# Altium footprint library LukaLIBRARY.PcbLib: 784 footprints (part 31 of 49)
Each footprint in its own frame and in the unit in brackets; x right, y up, seen from the top. Pads: shape width x height; smd on the part's side, far side on the other; paste and mask are expansions set on the pad; w line width, h text height; cw(c..) or ccw(c..) is an arc to the next point about the centre after c.
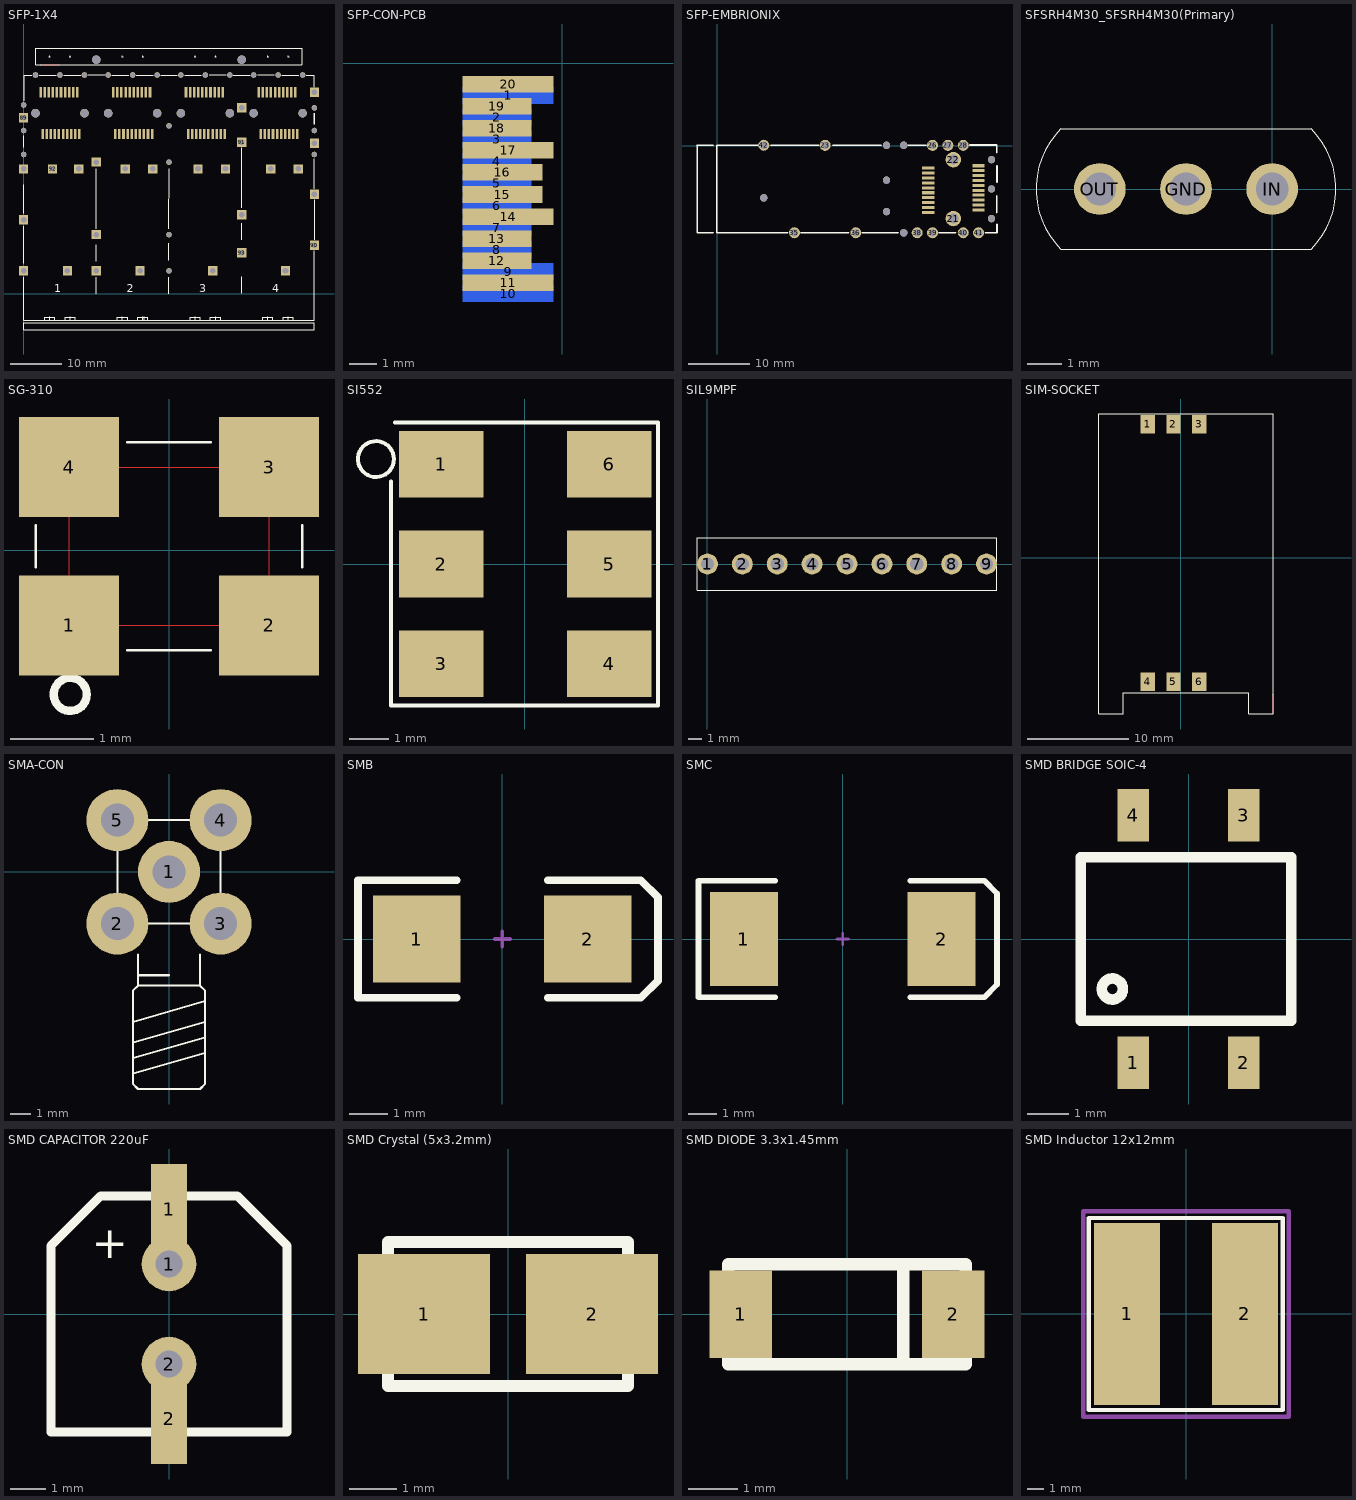
[diagram p30: the footprints below, top view; thin cyan lines are the x and y axes]

## SFP-1X4 [mm]
pads (139):
  rect 0.5x2 smd mask-25.4: 1(3.731,31.299) 2(4.531,31.299) 3(5.331,31.299) 4(6.131,31.299) 5(6.931,31.299) 6(7.731,31.299) 7(8.531,31.299) 8(9.331,31.299) 9(10.131,31.299) 10(10.931,31.299) 11(10.531,39.499) 12(9.731,39.499) 13(8.931,39.499) 14(8.131,39.499) 15(7.331,39.499) 16(6.531,39.499) 17(5.731,39.499) 18(4.931,39.499) 19(4.131,39.499) 20(3.331,39.499) 21(17.981,31.299) 22(18.781,31.299) 23(19.581,31.299) 24(20.381,31.299) 25(21.181,31.299) 26(21.981,31.299) 27(22.781,31.299) 28(23.581,31.299) 29(24.381,31.299) 30(25.181,31.299) 31(24.781,39.499) 32(23.981,39.499) 33(23.181,39.499) 34(22.381,39.499) 35(21.581,39.499) 36(20.781,39.499) 37(19.981,39.499) 38(19.181,39.499) 39(18.381,39.499) 40(17.581,39.499) 41(32.231,31.299) 42(33.031,31.299) 43(33.831,31.299) 44(34.631,31.299) 45(35.431,31.299) 46(36.231,31.299) 47(37.031,31.299) 48(37.831,31.299) 49(38.631,31.299) 50(39.431,31.299) 51(39.031,39.499) 52(38.231,39.499) 53(37.431,39.499) 54(36.631,39.499) 55(35.831,39.499) 56(35.031,39.499) 57(34.231,39.499) 58(33.431,39.499) 59(32.631,39.499) 60(31.831,39.499) 61(46.481,31.299) 62(47.281,31.299) 63(48.081,31.299) 64(48.881,31.299) 65(49.681,31.299) 66(50.481,31.299) 67(51.281,31.299) 68(52.081,31.299) 69(52.881,31.299) 70(53.681,31.299) 71(53.281,39.499) 72(52.481,39.499) 73(51.681,39.499) 74(50.881,39.499) 75(50.081,39.499) 76(49.281,39.499) 77(48.481,39.499) 78(47.681,39.499) 79(46.881,39.499) 80(46.081,39.499)
  round 1.1 hole 1: 81(2.33,42.88) 82(7.13,42.88) 83(11.93,42.88) 84(16.58,42.88) 85(21.38,42.88) 86(26.18,42.88) 87(30.83,42.88) 88(35.63,42.88) 107(0,27.3) 108(0,32) 109(0,37) 123(40.43,42.88) 124(45.08,42.88) 125(49.88,42.88) 126(54.68,42.88) 129(28.5,25.8) 130(57,36.45) 131(28.5,4.5) 132(57,32) 133(28.5,32.9) 134(28.5,11.6) 135(57,27.3)
  rect 1.8x1.8 hole 1.1 mask-25.4: 89(0,34.5) 90(57,9.5) 91(42.75,29.7) 92(5.68,24.49) 93(42.75,8.05) 102(10.8,24.49) 103(42.75,15.5) 104(0,24.49) 105(19.93,24.49) 106(34.18,24.49) 110(14.25,25.82) 111(8.58,4.5) 112(48.43,24.49) 113(0,14.5) 114(25.33,24.49) 115(39.58,24.49) 116(14.25,11.6) 117(53.83,24.49) 118(0.001,4.509) 119(22.83,4.51) 120(37.08,4.5) 121(14.25,4.5) 122(51.33,4.5) 136(42.75,36.45) 137(57,19.5) 138(57,29.5) 139(57,39.5)
  round 1.7 hole 1.6: 94(2.331,35.399) 95(11.931,35.399) 96(16.581,35.399) 97(26.181,35.399) 98(30.831,35.399) 99(40.431,35.399) 100(45.081,35.399) 101(54.681,35.399) 127(14.25,45.88) 128(42.75,45.88)
Top Layer:
  lines w0.1: 3.34,44.92 7.04,44.92 ; 4.14,48.12 5.84,48.12
Top Overlay:
  lines w0.01: 0,0 0,-5.18 57,-5.18 57,0 ; 4.12,-5.18 4.12,-4.57 5.12,-4.57 ; 5.12,-5.18 5.12,-4.48 ; 5.12,-4.58 6.12,-4.58 6.12,-5.17 ; 8.12,-5.18 8.12,-4.57 9.12,-4.57 ; 9.12,-5.18 9.12,-4.48 ; 9.12,-4.58 10.12,-4.58 10.12,-5.17 ; 18.37,-5.19 18.37,-4.58 19.37,-4.58 ; 19.37,-5.18 19.37,-4.48 ; 19.37,-4.59 20.37,-4.59 20.37,-5.18 ; 22.38,-5.18 22.38,-4.57 23.38,-4.57 ; 23.38,-5.18 23.38,-4.48 ; 23.38,-4.58 24.38,-4.58 24.38,-5.17 ; 23.63,-5.18 23.63,-4.48 ; 32.62,-5.18 32.62,-4.57 33.62,-4.57 ; 33.62,-5.18 33.62,-4.48 ; 33.62,-4.58 34.62,-4.58 34.62,-5.17 ; 36.62,-5.18 36.62,-4.57 37.62,-4.57 ; 37.62,-5.18 37.62,-4.48 ; 37.62,-4.58 38.62,-4.58 38.62,-5.17 ; 46.87,-5.18 46.87,-4.57 47.87,-4.57 ; 47.87,-5.18 47.87,-4.48 ; 47.87,-4.58 48.87,-4.58 48.87,-5.17 ; 50.88,-5.18 50.88,-4.57 51.88,-4.57 ; 51.88,-5.18 51.88,-4.48 ; 51.88,-4.58 52.88,-4.58 52.88,-5.17 ; 0,-7.04 0,-5.71 57,-5.71 57,-7.04 0,-7.04
  lines w0.05: 4.98,46.49 5.27,46.49 ; 5.12,46.35 5.12,46.64 ; 8.98,46.49 9.27,46.49 ; 9.12,46.35 9.12,46.64 ; 19.24,46.49 19.53,46.49 ; 19.38,46.35 19.38,46.64 ; 23.24,46.49 23.53,46.49 ; 23.38,46.35 23.38,46.64 ; 33.48,46.49 33.77,46.49 ; 33.62,46.35 33.62,46.64 ; 37.48,46.49 37.77,46.49 ; 37.62,46.35 37.62,46.64 ; 47.74,46.49 48.03,46.49 ; 47.88,46.35 47.88,46.64 ; 51.74,46.49 52.03,46.49 ; 51.88,46.35 51.88,46.64
  lines w0.1: 0,0.01 0.001,3.259 ; 0,28.75 0,31.02 ; 0.001,5.939 0.001,13.219 ; 0.001,37.879 0,42.88 1.591,42.881 ; 0.011,15.779 0.011,21.339 ; 3.06,42.88 6.36,42.88 ; 7.88,42.88 11.18,42.88 ; 12.6,42.89 15.9,42.89 ; 14.24,12.78 14.241,24.489 ; 14.25,0.02 14.251,3.269 ; 14.26,6.38 14.261,9.629 ; 17.31,42.88 20.61,42.88 ; 22.09,42.88 25.39,42.88 ; 26.84,42.88 30.14,42.88 ; 28.49,0.01 28.491,3.259 ; 28.49,6.61 28.491,9.859 ; 28.5,12.79 28.501,24.499 ; 31.54,42.88 34.84,42.88 ; 36.4,42.89 39.7,42.89 ; 41.1,42.88 44.4,42.88 ; 42.74,10.6 42.741,13.849 ; 42.75,0.07 42.751,3.319 ; 42.75,16.91 42.751,28.619 ; 45.86,42.89 49.16,42.89 ; 50.6,42.88 53.9,42.88 ; 54.54,44.92 2.34,44.92 2.34,48.12 54.64,48.12 54.64,44.92 ; 55.41,42.88 56.99,42.88 56.99,40.52 ; 57,0 57,8.4 ; 57,18.41 57.01,10.63 ; 57,20.61 57,26.49
  lines w0.254: 56.99,35.42 56.991,33.239
  text "1" at 5.97,0.28 h1.59
  text "4" at 48.71,0.29 h1.59
  text "2" at 20.23,0.33 h1.59
  text "3" at 34.47,0.3 h1.59
Top Solder:
  drawing of 107 lines, arcs and shapes, not listed
Bottom Solder:
  region: 0.9,13.6 0.9,15.4 -0.9,15.4 -0.9,13.6
  region: 0.9,23.59 0.9,25.39 -0.9,25.39 -0.9,23.59
  region: 11.7,23.59 11.7,25.39 9.9,25.39 9.9,23.59
  region: 15.15,10.7 15.15,12.5 13.35,12.5 13.35,10.7
  region: 15.15,24.92 15.15,26.72 13.35,26.72 13.35,24.92
  region: 26.23,23.59 26.23,25.39 24.43,25.39 24.43,23.59
  region: 35.08,23.59 35.08,25.39 33.28,25.39 33.28,23.59
  region: 40.48,23.59 40.48,25.39 38.68,25.39 38.68,23.59
  region: 49.33,23.59 49.33,25.39 47.53,25.39 47.53,23.59
  region: 57.9,8.6 57.9,10.4 56.1,10.4 56.1,8.6
  region: 54.73,23.59 54.73,25.39 52.93,25.39 52.93,23.59
  region: 57.9,28.6 57.9,30.4 56.1,30.4 56.1,28.6
  region: 57.9,38.6 57.9,40.4 56.1,40.4 56.1,38.6
  region: 0.901,3.609 0.901,5.409 -0.899,5.409 -0.899,3.609
  region: 0.9,33.6 0.9,35.4 -0.9,35.4 -0.9,33.6
  region: 9.48,3.6 9.48,5.4 7.68,5.4 7.68,3.6
  region: 15.15,3.6 15.15,5.4 13.35,5.4 13.35,3.6
  region: 23.73,3.61 23.73,5.41 21.93,5.41 21.93,3.61
  region: 37.98,3.6 37.98,5.4 36.18,5.4 36.18,3.6
  region: 57.9,18.6 57.9,20.4 56.1,20.4 56.1,18.6
  region: 6.58,23.59 6.58,25.39 4.78,25.39 4.78,23.59
  region: 20.83,23.59 20.83,25.39 19.03,25.39 19.03,23.59
  region: 43.65,7.15 43.65,8.95 41.85,8.95 41.85,7.15
  region: 43.65,14.6 43.65,16.4 41.85,16.4 41.85,14.6
  region: 43.65,28.8 43.65,30.6 41.85,30.6 41.85,28.8
  region: 52.23,3.6 52.23,5.4 50.43,5.4 50.43,3.6
  region: 43.65,35.55 43.65,37.35 41.85,37.35 41.85,35.55

## SFP-CON-PCB [mm]
pads (20):
  rect 3.3x0.6 smd far side mask-25.4: 1(-1.98,-1.16) 9(-1.98,-7.56) 10(-1.98,-8.36)
  rect 2.5x0.6 smd far side mask-25.4: 2(-2.38,-1.96) 3(-2.38,-2.76) 4(-2.38,-3.56) 5(-2.38,-4.36) 6(-2.38,-5.16) 7(-2.38,-5.96) 8(-2.38,-6.76)
  rect 3.3x0.6 smd mask-25.4: 11(-1.98,-7.96) 14(-1.98,-5.56) 17(-1.98,-3.16) 20(-1.98,-0.76)
  rect 2.5x0.6 smd mask-25.4: 12(-2.38,-7.16) 13(-2.38,-6.36) 18(-2.38,-2.36) 19(-2.38,-1.56)
  rect 2.9x0.6 smd mask-25.4: 15(-2.18,-4.76) 16(-2.18,-3.96)
Top Solder:
  region: -3.63,-7.46 -1.13,-7.46 -1.13,-6.86 -3.63,-6.86
  region: -3.63,-2.66 -1.13,-2.66 -1.13,-2.06 -3.63,-2.06
  region: -3.63,-1.86 -1.13,-1.86 -1.13,-1.26 -3.63,-1.26
  region: -3.63,-6.66 -1.13,-6.66 -1.13,-6.06 -3.63,-6.06
  region: -3.63,-8.26 -0.33,-8.26 -0.33,-7.66 -3.63,-7.66
  region: -3.63,-5.06 -0.73,-5.06 -0.73,-4.46 -3.63,-4.46
  region: -3.63,-3.46 -0.33,-3.46 -0.33,-2.86 -3.63,-2.86
  region: -3.63,-1.06 -0.33,-1.06 -0.33,-0.46 -3.63,-0.46
  region: -3.63,-5.86 -0.33,-5.86 -0.33,-5.26 -3.63,-5.26
  region: -3.63,-4.26 -0.73,-4.26 -0.73,-3.66 -3.63,-3.66
Bottom Solder:
  region: -3.63,-7.06 -1.13,-7.06 -1.13,-6.46 -3.63,-6.46
  region: -3.63,-3.86 -1.13,-3.86 -1.13,-3.26 -3.63,-3.26
  region: -3.63,-2.26 -1.13,-2.26 -1.13,-1.66 -3.63,-1.66
  region: -3.63,-3.06 -1.13,-3.06 -1.13,-2.46 -3.63,-2.46
  region: -3.63,-4.66 -1.13,-4.66 -1.13,-4.06 -3.63,-4.06
  region: -3.63,-5.46 -1.13,-5.46 -1.13,-4.86 -3.63,-4.86
  region: -3.63,-6.26 -1.13,-6.26 -1.13,-5.66 -3.63,-5.66
  region: -3.63,-7.86 -0.33,-7.86 -0.33,-7.26 -3.63,-7.26
  region: -3.63,-8.66 -0.33,-8.66 -0.33,-8.06 -3.63,-8.06
  region: -3.63,-1.46 -0.33,-1.46 -0.33,-0.86 -3.63,-0.86

## SFP-EMBRIONIX [mm]
pads (42):
  rect 2x0.5 smd mask-25.4: 1(34.41,-3.69) 2(34.41,-4.49) 3(34.41,-5.29) 4(34.41,-6.09) 5(34.41,-6.89) 6(34.41,-7.69) 7(34.41,-8.49) 8(34.41,-9.29) 9(34.41,-10.09) 10(34.41,-10.89) 11(42.61,-10.49) 12(42.61,-9.69) 13(42.61,-8.89) 14(42.61,-8.09) 15(42.61,-7.29) 16(42.61,-6.49) 17(42.61,-5.69) 18(42.61,-4.89) 19(42.61,-4.09) 20(42.61,-3.29)
  round 2.524 hole 1.6: 21(38.51,-11.89) 22(38.51,-2.29)
  round 1.8 hole 1.2 mask-25.4: 23(17.62,0.04) 26(35.11,0.04) 27(37.61,0.04) 28(40.11,0.04) 35(12.61,-14.21) 36(22.61,-14.21) 38(32.61,-14.21) 39(35.11,-14.21) 40(40.11,-14.21) 41(42.61,-14.21) 42(7.62,0.05)
  round 1.2 hole 1.2 mask-25.4: 24(27.62,0.04) 25(30.41,0.04) 29(44.72,-2.29) 30(44.71,-7.07) 31(44.71,-11.9) 32(27.61,-5.63) 33(7.62,-8.53) 34(27.62,-10.76) 37(30.41,-14.22)
Top Layer:
  lines w0.01: 44.71,-11.9 44.71,-11.87
Top Overlay:
  lines w0.254: -3.26,0.03 -0.63,0.03 ; -3.25,0.03 -3.25,-14.24 -0.63,-14.24 ; -0.02,-14.22 -0.02,0.03 ; -0.02,0.04 7.8,0.04 ; -0.01,-14.23 11.55,-14.23 ; 8.74,0.04 16.56,0.04 ; 13.65,-14.23 21.46,-14.23 ; 18.85,0.03 26.79,0.03 ; 23.66,-14.23 29.5,-14.22 ; 31.16,0.03 34.07,0.03 ; 36.14,-14.19 38.9,-14.19 ; 41.16,0.09 45.6,0.09 45.6,-1.21 ; 43.72,-14.19 45.61,-14.19 45.61,-12.82 ; 45.6,-10.95 45.6,-8.19 45.6,-8.17 ; 45.61,-6.01 45.61,-3.32
Top Solder:
  drawing of 40 lines, arcs and shapes, not listed
Bottom Solder:
  drawing of 20 lines, arcs and shapes, not listed

## SFSRH4M30_SFSRH4M30(Primary) [mil]
pads (3):
  round 60 hole 38: GND(-100,0) IN(0,0) OUT(-200,0)
Top Overlay:
  lines w1: -245,-70 cw(c-175,0) -245,70 45,70 cw(c-25,0) 45,-70 -245,-70

## SG-310 [mm]
pads (4):
  rect 1.2x1.2 smd: 1(-1.2,-0.9) 2(1.2,-0.9) 3(1.2,1) 4(-1.2,1)
Top Layer:
  lines w0.01: -1.2,-0.9 1.2,-0.9 1.2,1 -1.2,1 -1.2,-0.9
Top Overlay:
  circle w0.1: c-1.185,-1.728 r0.198
  lines w0.03: -1.6,-0.2 -1.6,0.3 ; -0.5,-1.2 0.5,-1.2 ; -0.5,1.3 0.5,1.3 ; 1.6,-0.2 1.6,0.3

## SI552 [mm]
pads (6):
  rect 2.15x1.7 smd mask-25.4: 1(-2.12,2.54) 2(-2.12,0) 3(-2.12,-2.54) 4(2.16,-2.54) 5(2.16,0) 6(2.16,2.54)
Top Overlay:
  circle w0.1: c-3.785,2.672 r0.457
  lines w0.1: -3.4,2.1 -3.4,-3.6 3.4,-3.6 3.4,3.6 -3.3,3.6
Top Solder:
  region: -3.195,-3.39 -1.045,-3.39 -1.045,-1.69 -3.195,-1.69
  region: -3.195,1.69 -1.045,1.69 -1.045,3.39 -3.195,3.39
  region: 1.085,-3.39 3.235,-3.39 3.235,-1.69 1.085,-1.69
  region: 1.085,1.69 3.235,1.69 3.235,3.39 1.085,3.39
  region: -3.195,-0.85 -1.045,-0.85 -1.045,0.85 -3.195,0.85
  region: 1.085,-0.85 3.235,-0.85 3.235,0.85 1.085,0.85

## SIL9MPF [mil]
pads (9):
  round 60 hole 38: 1(0,0) 2(100,0) 3(200,0) 4(300,0) 5(400,0) 6(500,0) 7(600,0) 8(700,0) 9(800,0)
Top Overlay:
  lines w1: -30,-75 -30,75 830,75 830,-75 -30,-75

## SIM-SOCKET [mm]
pads (6):
  rect 1.4x1.8 smd mask-25.4: 1(-3.28,13.18) 2(-0.74,13.18) 3(1.8,13.18) 4(-3.28,-12.22) 5(-0.74,-12.22) 6(1.8,-12.22)
Top Layer:
  lines w0.03: -8.1,-15.4 -8.1,-10.5 ; 9.1,-15.4 9.1,-13.5
Top Overlay:
  lines w0.03: -8.1,-15.4 -5.7,-15.4 -5.7,-13.3 6.7,-13.3 6.7,-15.4 9.1,-15.4 9.1,14.2 -8.1,14.2 -8.1,-15.4
Top Solder:
  region: -3.915,-12.931 -2.645,-12.931 -2.645,-11.509 -3.915,-11.509
  region: -3.915,12.469 -2.645,12.469 -2.645,13.891 -3.915,13.891
  region: 1.165,-12.931 2.435,-12.931 2.435,-11.509 1.165,-11.509
  region: 1.165,12.469 2.435,12.469 2.435,13.891 1.165,13.891
  region: -1.375,-12.931 -0.105,-12.931 -0.105,-11.509 -1.375,-11.509
  region: -1.375,12.469 -0.105,12.469 -0.105,13.891 -1.375,13.891

## SMA-CON [mm]
pads (5):
  round 3 hole 1.6 mask-25.4: 1(0,0) 2(-2.5,-2.5) 3(2.5,-2.5) 4(2.5,2.5) 5(-2.5,2.5)
Top Overlay:
  lines w0.1: -2.5,-1 -2.5,1 ; -1.75,-9.75 1.75,-8.75 ; -1.75,-9 1.75,-8 ; -1.75,-8.25 1.75,-7.25 ; -1.75,-7.25 1.75,-6.25 ; -1.5,-5 0,-5 ; -1.5,-4 -1.5,-5.5 ; -1,-2.5 0,-2.5 1,-2.5 ; -1,2.5 1,2.5 ; 0,-10.5 1.5,-10.5 1.75,-10.25 1.75,-5.75 1.5,-5.5 ; 0.25,-10.5 -1.5,-10.5 -1.75,-10.25 -1.75,-5.75 -1.5,-5.5 ; 1.5,-4 1.5,-5.5 ; 2.5,-1 2.5,1 ; -1.5,-5.5 0,-5.5 1.5,-5.5
Top Solder:
  drawing of 5 lines, arcs and shapes, not listed
Bottom Solder:
  drawing of 5 lines, arcs and shapes, not listed

## SMB [mm] "DO-214-AA/SMB; 2 C-Bend Leads; Body 5.3 x 3.6 mm, inc. leads (LxW)"
height 2.54
pads (2):
  rect 2.3x2.3 smd: 1(-2.25,0) 2(2.25,0)
Top Overlay:
  lines w0.2: -1.2,-1.55 -3.8,-1.55 -3.8,1.55 -1.2,1.55 ; 1.2,-1.55 3.65,-1.55 4.1,-1.1 4.1,1.1 3.65,1.55 1.2,1.55
Mechanical 1:
  lines w0.1: -0.2,0 0.2,0 ; 0,-0.2 0,0.2

## SMC [mm] "DO-214-AB/SMC; 2 C-Bend Leads; Body 7.9 x 5.9 mm, inc. leads (LxW)"
height 2.65
pads (2):
  rect 2.4x3.3 smd: 1(-3.475,0) 2(3.475,0)
Top Overlay:
  lines w0.2: -2.375,-2.05 -5.075,-2.05 -5.075,2.05 -2.375,2.05 ; 2.375,-2.05 4.975,-2.05 5.425,-1.6 5.425,1.6 4.975,2.055 ; 2.375,2.05 4.975,2.05
Mechanical 1:
  lines w0.1: -0.2,0 0.2,0 ; 0,-0.2 0,0.2

## SMD BRIDGE SOIC-4 [mil]
pads (4):
  rect 30x50 smd: 1(-52.5,-117.5) 2(52.5,-117.5) 3(52.5,117.5) 4(-52.5,117.5)
Top Overlay:
  circle w10: c-72.5,-47.5 r10
  lines w10: -102.5,-77.5 97.5,-77.5 97.5,77.5 -102.5,77.5 -102.5,-77.5

## SMD CAPACITOR 220uF [mil]
pads (4):
  round 60 hole 30: 1(0,55) 2(0,-55)
  rect 40x100 smd: 1(0,115) 2(0,-115)
Top Overlay:
  lines w10: -130,-130 -130,75 -75,130 75,130 130,75 130,-130 -130,-130
  text "+" at -85,50 h60

## SMD Crystal (5x3.2mm) [mil]
pads (2):
  rect 110x100 smd: 1(-70,0) 2(70,0)
Top Overlay:
  lines w10: -100,-60 -100,60 100,60 100,-60 -100,-60

## SMD DIODE 3.3x1.45mm [mil]
pads (2):
  rect 50x70 smd: 1(-85,0) 2(85,0)
Top Overlay:
  lines w10: 45,-40 45,40 ; -95,-40 -95,40 95,40 95,-40 -95,-40

## SMD Inductor 12x12mm [mm]
pads (2):
  rect 4x11 smd: 1(-3.556,0) 2(3.556,0)
Top Overlay:
  lines w0.254: -5.867,-5.791 5.842,-5.791 5.842,5.791 -5.867,5.791 -5.867,-5.791
Mechanical 15:
  lines w0.254: -6.198,-6.202 6.202,-6.202 6.202,6.198 -6.198,6.198 -6.198,-6.202